# Altium footprint library 9-Pcblib_Con.PcbLib: 266 footprints (part 13 of 17)
Each footprint in its own frame and in the unit in brackets; x right, y up, seen from the top. Pads: shape width x height; smd on the part's side, far side on the other; paste and mask are expansions set on the pad; w line width, h text height; cw(c..) or ccw(c..) is an arc to the next point about the centre after c.
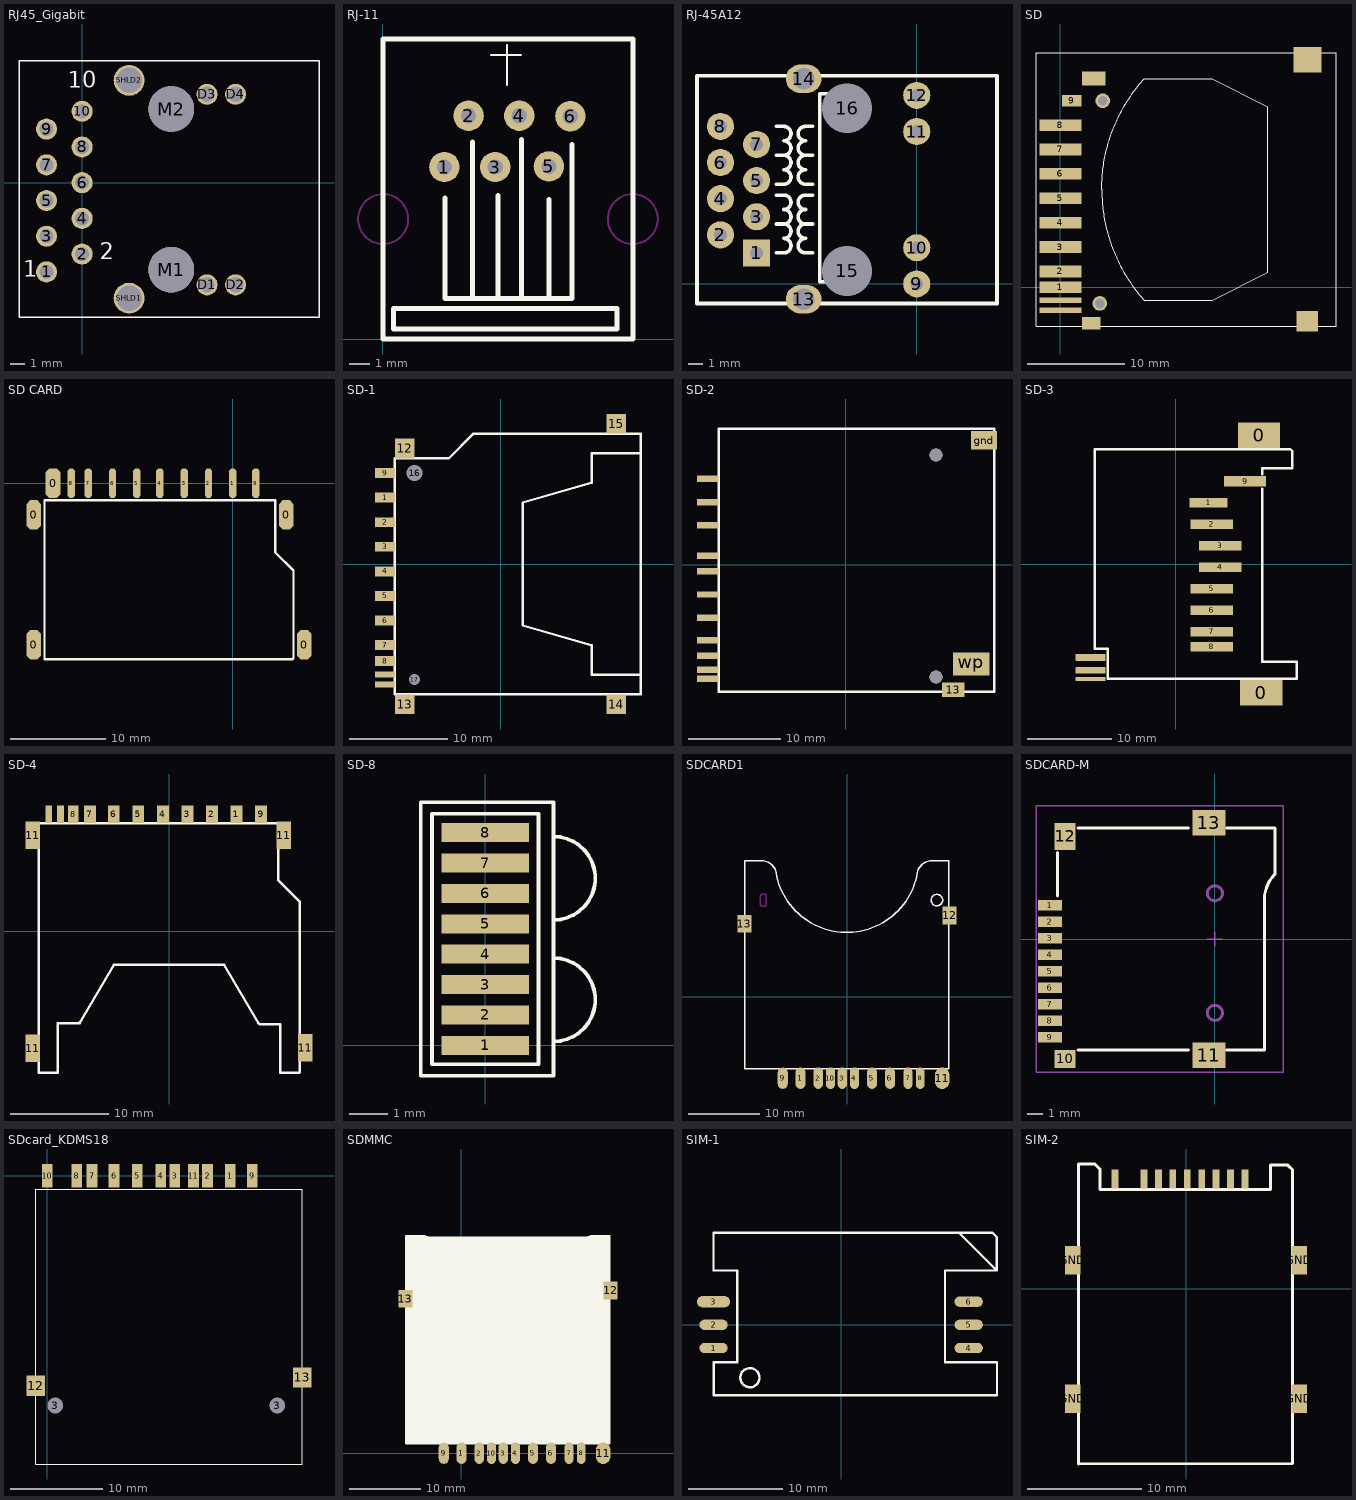
[diagram p12: the footprints below, top view; thin cyan lines are the x and y axes]

## RJ45_Gigabit [mm]
pads (18):
  round 1.5 hole 1: 1(-2.53,-6.35) 2(0,-5.08) 3(-2.53,-3.81) 4(0,-2.54) 5(-2.53,-1.27) 6(0,0) 7(-2.53,1.27) 8(0,2.54) 9(-2.53,3.81) 10(0,5.08)
  round 1.5 hole 1.1: D1(8.89,-7.27) D2(10.92,-7.27) D3(8.89,6.29) D4(10.92,6.29)
  round 3.25 hole 3.25 unplated paste+0 mask+0: M1(6.35,-6.19) M2(6.35,5.24)
  round 2.2 hole 1.8: SHLD1(3.35,-8.22) SHLD2(3.35,7.28)
Top Overlay:
  lines w0.1: -4.49,-9.575 16.86,-9.575 16.86,8.675 -4.49,8.675 -4.49,-9.575
  text "2" at 1.27,-5.842 h2
  text "1" at -4.175,-7.075 h2
  text "10" at -1.016,6.35 h2
3D body: height 16.12, standoff -2.58, extent -4.435,-10.686 17.355,9.304

## RJ-11 [mil]
height 590.55
pads (6):
  round 60 hole 30: 1(121.58,338.63) 2(169.06,439.73) 3(221.58,338.63) 4(269.06,439.73) 5(327.25,339.73) 6(369.46,438.63)
Top Overlay:
  lines w3.94: 213.07,559.08 272.13,559.08 ; 244.57,500.02 244.57,559.08 ; 244.57,555.14 244.57,578.76
  lines w10: 123,277.53 123,80.04 373,80.04 373,382.49 ; 176.94,80.04 176.94,387.53 ; 226.94,80.04 226.94,282.56 ; 273,80.04 273,392.88 ; 327.72,80.04 327.72,274.38 ; 488.66,0.04 0.95,0.04 0.95,590.6 493.08,590.6 ; 492.76,0.04 492.76,590.6 ; 20.95,20.04 20.95,60.04 460.95,60.04 460.95,20.04 20.95,20.04
Keep-Out Layer:
  circle w3.94: c492.44,236.11 r49.21
  circle w3.94: c0.95,236.11 r49.21

## RJ-45A12 [mil]
pads (16):
  rect 75x75 hole 35.43: 1(-442.91,85.83)
  round 75 hole 35.43: 2(-542.91,135.83) 3(-442.91,185.83) 4(-542.91,235.83) 5(-442.91,285.83) 6(-542.91,335.83) 7(-442.91,385.83) 8(-542.91,435.83) 9(0,0) 10(0,100) 11(0,421.65) 12(0,521.65)
  oval 98.43x78.74 hole 59.06: 13(-312.99,-42.13) 14(-312.99,567.32)
  round 130 hole 137.8: 15(-192.91,35.83) 16(-192.91,485.83)
Top Overlay:
  lines w10: -387.91,85.83 -367.91,85.83 ccw(c-367.91,105.83) -367.91,125.83 ccw(c-367.91,145.83) -367.91,165.83 ; -387.91,165.83 -367.91,165.83 ; -387.91,245.83 -367.91,245.83 cw(c-367.91,225.83) -367.91,205.83 cw(c-367.91,185.83) -367.91,165.83 ; -387.91,275.83 -367.91,275.83 ccw(c-367.91,295.83) -367.91,315.83 ccw(c-367.91,335.83) -367.91,355.83 ; -387.91,355.83 -367.91,355.83 ; -387.91,435.83 -367.91,435.83 cw(c-367.91,415.83) -367.91,395.83 cw(c-367.91,375.83) -367.91,355.83 ; -287.91,85.83 -307.91,85.83 cw(c-307.91,105.83) -307.91,125.83 cw(c-307.91,145.83) -307.91,165.83 ; -287.91,165.83 -307.91,165.83 ; -287.91,245.83 -307.91,245.83 ccw(c-307.91,225.83) -307.91,205.83 ccw(c-307.91,185.83) -307.91,165.83 ; -287.91,275.83 -307.91,275.83 cw(c-307.91,295.83) -307.91,315.83 cw(c-307.91,335.83) -307.91,355.83 ; -287.91,355.83 -307.91,355.83 ; -287.91,435.83 -307.91,435.83 ccw(c-307.91,415.83) -307.91,395.83 ccw(c-307.91,375.83) -307.91,355.83 ; -247.91,5.83 -267.91,5.83 -267.91,525.83 -247.91,525.83 ; -607.91,-54.17 -607.91,575.83 222,575.83 222,-54.17 -607.91,-54.17
Multi-Layer:
  text "J10" at -517.7,505.32 h25
3D body: height 59.06, standoff -590.55, extent -605.26,-53 237.26,572.2

## SD [mil]
pads (17):
  rect 169.3x47.2 smd: 1(0,0) 2(0,64) 3(0,162.4) 4(0,260.8) 5(0,359.2) 6(0,457.7) 7(0,556.1) 8(0,654.5)
  rect 78.7x47.2 smd: 9(45.3,752.9)
  rect 169.3x23.62 smd: 10(0,-52.19) 11(0,-92.57)
  rect 74.8x51.2 smd: ""(125,-144.7)
  rect 94.5x55.1 smd: ""(133.86,842.5)
  round 59.1 hole 39.37: ""(159.02,-65.01) ""(170.83,752.9)
  rect 86.6x82.7 smd: ""(997,-136.8)
  rect 114.2x102.4 smd: ""(997,918.26)
Top Overlay:
  lines w3.94: -98.42,-156.5 -98.42,945.8 1112.2,945.8 1112.2,-156.5 -98.42,-156.5 ; 166.93,394.7 167.03,384.6 167.23,374.6 167.63,364.6 168.13,354.6 168.83,344.6 169.63,334.7 170.63,324.7 171.73,314.8 172.93,304.8 174.43,294.9 175.93,285 177.63,275.2 179.53,265.3 181.53,255.5 183.73,245.7 186.03,236 188.43,226.3 191.03,216.6 193.73,207 196.63,197.4 199.63,187.8 202.83,178.3 206.13,168.9 209.63,159.5 213.23,150.1 216.93,140.8 220.83,131.6 224.83,122.4 228.93,113.3 233.23,104.3 237.63,95.3 242.13,86.4 246.83,77.5 251.63,68.7 256.63,60 261.63,51.4 266.83,42.8 272.23,34.3 277.63,25.9 283.23,17.6 288.93,9.4 294.73,1.3 300.73,-6.8 306.73,-14.8 312.93,-22.6 319.23,-30.4 325.63,-38.1 332.23,-45.7 338.83,-53.2 612.83,-53.2 836.23,60 836.23,729.3 612.83,842.5 338.83,842.5 332.23,835 325.63,827.4 319.23,819.7 312.93,812 306.73,804.1 300.73,796.1 294.73,788.1 288.93,779.9 283.23,771.7 277.63,763.4 272.23,755 266.83,746.5 261.63,737.9 256.63,729.3 251.63,720.6 246.83,711.8 242.13,703 237.63,694 233.23,685.1 228.93,676 224.83,666.9 220.83,657.7 216.93,648.5 213.23,639.2 209.63,629.8 206.13,620.4 202.83,611 199.63,601.5 196.63,591.9 193.73,582.4 191.03,572.7 188.43,563 186.03,553.3 183.73,543.6 181.53,533.8 179.53,524 177.63,514.2 175.93,504.3 174.43,494.4 172.93,484.5 171.73,474.6 170.63,464.6 169.63,454.7 168.83,444.7 168.13,434.7 167.63,424.7 167.23,414.7 167.03,404.7 166.93,394.7

## SD CARD [mil]
pads (14):
  oct 60x120 smd: 0(-820,-665) 0(-820,-130) 0(-740,0) 0(220,-130) 0(295,-665)
  oct 30x120 smd: 1(0,0) 2(-100,0) 3(-200,0) 4(-300,0) 5(-395,0) 6(-495,0) 7(-595,0) 8(-665,0) 9(95,0)
Top Overlay:
  lines w10: -775,-725 245,-725 250,-720 250,-360 175,-285 175,-70 -775,-70 -775,-725
3D body: height 118.57, standoff -38.91, extent -848.99,-1369.64 276.99,28

## SD-1 [mm]
pads (17):
  rect 2x1 smd: 1(-11.75,6.75) 2(-11.75,4.25) 3(-11.75,1.75) 4(-11.75,-0.75) 5(-11.75,-3.25) 6(-11.75,-5.75) 7(-11.75,-8.25) 8(-11.75,-9.875) 9(-11.75,9.25)
  rect 2x0.6 smd: 10(-11.75,-12.25) 11(-11.75,-11.25)
  rect 2x2 smd: 12(-9.75,11.75) 13(-9.75,-14.25) 14(11.75,-14.25) 15(11.75,14.25)
  round 1.5 hole 1.6: 16(-8.75,9.25)
  round 1 hole 1.1: 17(-8.75,-11.75)
Top Overlay:
  lines w0.254: 14.25,-11.25 9.25,-11.25 9.25,-8.25 2.25,-6.25 2.25,6.25 9.25,8.25 9.25,11.25 14.25,11.25 ; -10.75,-13.25 -10.75,10.75 -5.25,10.75 -2.75,13.25 14.25,13.25 14.25,-13.25 -10.75,-13.25

## SD-2 [mm]
pads (14):
  rect 2.35x0.7 smd: 1(-14.935,6.8) 2(-14.935,4.3) 3(-14.935,1) 4(-14.935,-0.7) 5(-14.935,-3.2) 6(-14.935,-5.7) 7(-14.935,-8.13) 8(-14.935,-9.82) 9(-14.935,9.3) cd(-14.935,-11.32) com(-14.935,-12.32)
  rect 2.4x1.6 smd: 13(11.595,-13.5)
  rect 2.8x2 smd: gnd(14.935,13.5)
  rect 3.95x2.5 smd: wp(13.565,-10.7)
via 9.735,11.9 diameter 1.4 hole 1.4
via 9.735,-12.1 diameter 1.4 hole 1.4
Top Overlay:
  lines w0.254: -13.76,-13.72 16.045,-13.72 16.045,14.72 -13.76,14.72 -13.76,-13.72

## SD-3 [mm]
pads (14):
  rect 5x3 smd: 0(9.843,15.24) 0(10.097,-15.24)
  rect 4.5x1.143 smd: 1(3.874,7.239)
  rect 5x1.143 smd: 2(4.255,4.699) 3(5.271,2.159) 4(5.271,-0.381) 5(4.255,-2.921) 6(4.255,-5.461) 7(4.255,-8.001) 8(4.255,-9.779)
  rect 5x1.27 smd: 9(8.192,9.779)
  rect 3.556x0.8 smd: 10(-10.097,-11.049) 11(-10.097,-12.573)
  rect 3.556x0.5 smd: 12(-10.097,-13.589)
Top Overlay:
  lines w0.3: 7.683,-13.589 14.287,-13.589 14.287,-11.557 10.223,-11.557 10.223,8.889 ; 8.191,-13.589 -8.065,-13.589 -8.065,-10.033 -9.589,-10.033 -9.589,13.589 8.191,13.589 13.525,13.589 13.779,13.335 13.779,11.303 10.223,11.303 10.223,10.59

## SD-4 [mm]
pads (15):
  rect 1.2x1.8 smd: 1(6.858,11.917) 2(4.369,11.917) 3(1.875,11.908) 4(-0.625,11.908) 5(-3.125,11.908) 6(-5.625,11.908) 7(-8.05,11.908) 9(9.375,11.908)
  rect 1.1x1.8 smd: 8(-9.754,11.917)
  rect 0.7x1.8 smd: 10(-11.05,11.908) 12(-12.243,11.917)
  rect 1.5x2.8 smd: 11(-13.868,-11.917) 11(-13.868,9.774) 11(11.684,9.774) 11(13.868,-11.866)
Top Overlay:
  lines w0.254: -11.3,-9.383 -11.3,-14.383 -13.273,-14.383 -13.273,11.003 -13.259,11.017 11.1,11.017 11.1,5.207 13.289,3.018 13.3,3.018 13.3,-14.356 13.273,-14.383 11.3,-14.383 11.3,-9.484 9.258,-9.484 9.1,-9.326 ; -11.249,-9.377 -9.207,-9.377 -9.049,-9.219 ; -9.1,-9.377 -5.588,-3.383 ; -5.6,-3.383 5.6,-3.383 9.1,-9.377
Multi-Layer:
  circle w0.254: c9.5,8.657 r0.82
  circle w0.254: c-11.532,8.617 r0.58

## SD-8 [mm]
pads (8):
  rect 2.3x0.5 smd: 1(0,0) 2(0,0.8) 3(0,1.6) 4(0,2.4) 5(0,3.2) 6(0,4) 7(0,4.8) 8(0,5.6)
Top Overlay:
  lines w0.1: 1.8,0.102 ccw(c1.8,1.201) 1.8,2.3 ; 1.8,3.3 ccw(c1.8,4.399) 1.8,5.498 ; -1.7,-0.8 1.8,-0.8 1.8,6.4 -1.7,6.4 -1.7,-0.8 ; -1.4,-0.5 1.4,-0.5 1.4,6.1 -1.4,6.1 -1.4,-0.5

## SDCARD1 [mm]
height 1.2
pads (13):
  oval 1.4x3 smd: 1(-6.513,-11.36) 5(3.47,-11.36) 6(5.984,-11.36) 9(-8.976,-11.36)
  oval 1.3x3 smd: 2(-4.023,-11.36) 3(-0.671,-11.36) 4(1.031,-11.36) 10(-2.322,-11.36)
  oval 1.2x3 smd: 7(8.499,-11.36) 8(10.201,-11.36)
  oval 2x3 smd: 11(13.261,-11.373)
  rect 2x2.5 smd: 12(14.287,11.347) 13(-14.313,10.179)
Top Overlay:
  circle w0.203: c12.526,13.477 r0.8
  lines w0.203: -14.299,-10.023 14.201,-10.023 14.201,18.977 11.783,18.977 ccw(c11.783,16.977) 9.811,17.311 cw(c-0.049,18.977) -9.909,17.311 ccw(c-11.881,16.977) -11.881,18.977 -14.299,18.977 -14.299,-10.023
Keep-Out Layer:
  circle w0.203: c12.526,13.477 r0.8
  lines w0.203: -12.094,12.977 -12.094,13.977 ; -12.094,13.202 -12.094,12.922 ccw(c-11.794,12.922) -11.794,12.622 ; -12.094,14.014 cw(c-11.794,14.014) -11.794,14.314 ; -11.814,12.627 -11.574,12.627 ; -11.754,14.314 -11.554,14.314 cw(c-11.554,14.014) -11.254,14.014 ; -11.554,12.622 ccw(c-11.554,12.922) -11.254,12.922 -11.254,13.278 ; -11.254,12.977 -11.254,13.977
3D body: height 2.85, standoff -0.5, extent -14.408,-11.388 14.392,18.912

## SDCARD-M [mm] "TF卡"
height 1.5
pads (13):
  rect 1.6x0.7 smd: 1(-11.008,2.25) 2(-11.008,1.15) 3(-11.008,0.05) 4(-11.008,-1.05) 5(-11.008,-2.15) 6(-11.008,-3.25) 7(-11.008,-4.35) 8(-11.008,-5.45) 9(-11.008,-6.55)
  rect 1.4x1.2 smd: 10(-10,-8.004)
  rect 2.2x1.7 smd: 11(-0.4,-7.75) 13(-0.4,7.75)
  rect 1.4x1.8 smd: 12(-10,6.85)
Top Overlay:
  lines w0.2: -10.5,2.88 -10.5,5.756 ; -9.144,-7.4 -1.778,-7.4 ; -9.144,7.4 -1.778,7.4 ; 0.762,-7.4 3.3,-7.4 3.3,1.016 ; 0.762,7.4 4,7.4 4,4.318 ccw(c5.69,2.628) 3.3,2.628 3.3,0.762
Mechanical 1:
  circle w0.2: c0,-4.93 r0.5
  circle w0.2: c0,3.05 r0.5
Mechanical 15:
  lines w0.1: -0.5,0 0.5,0 ; 0,-0.5 0,0.5 ; -11.938,-8.89 4.572,-8.89 4.572,8.89 -11.938,8.89 -11.938,-8.89

## SDcard_KDMS18 [mm]
pads (15):
  rect 1.15x2.55 smd: 1(19.916,0) 2(17.426,0) 3(13.87,0) 4(12.346,0) 5(9.806,0) 6(7.266,0) 7(4.876,-0.001) 8(3.202,0) 9(22.306,0) 10(0,0) 11(15.902,0)
  round 1.5 hole 1.7: 3(0.891,-24.968) 3(25.021,-24.968)
  rect 2x2.2 smd: 12(-1.237,-22.809) 13(27.719,-21.92)
Top Overlay:
  lines w0.1: -1.224,-31.321 -1.224,-1.476 27.732,-1.476 27.732,-31.321 -1.224,-31.321

## SDMMC [mm]
pads (13):
  oval 1.4x3 smd: 1(0,0) 5(9.982,0) 6(12.497,0) 9(-2.464,0)
  oval 1.3x3 smd: 2(2.489,0) 3(5.842,0) 4(7.544,0) 10(4.191,0)
  oval 1.2x3 smd: 7(15.011,0) 8(16.713,0)
  oval 2x3 smd: 11(19.774,-0.013)
  rect 2x2.5 smd: 12(20.8,22.708) 13(-7.8,21.539)
Top Overlay:
  rectangle: -7.661,1.429 20.635,19.844
  rectangle: -7.762,19.717 20.66,30.258
  lines w0.203: -7.786,1.338 -7.786,30.338 -5.369,30.338 cw(c-5.369,28.338) -3.397,28.671 ccw(c6.464,30.338) 16.324,28.671 cw(c18.296,28.338) 18.296,30.338 20.714,30.338 20.714,1.338 -7.786,1.338
Keep-Out Layer:
  circle w0.203: c19.039,24.838 r0.8
  lines w0.203: -5.581,24.338 -5.581,25.338 ; -5.581,24.562 -5.581,24.282 ccw(c-5.281,24.282) -5.281,23.982 ; -5.581,25.375 cw(c-5.281,25.375) -5.281,25.675 ; -5.301,23.988 -5.061,23.988 ; -5.241,25.675 -5.041,25.675 cw(c-5.041,25.375) -4.741,25.375 ; -5.041,23.982 ccw(c-5.041,24.282) -4.741,24.282 -4.741,24.638 ; -4.741,24.338 -4.741,25.338

## SIM-1 [mm]
pads (6):
  oval 3x1.1 smd: 1(-13.5,-2.45) 2(-13.5,0) 4(13.5,-2.45) 5(13.5,0) 6(13.5,2.45)
  oval 3.5x1.2 smd: 3(-13.5,2.45)
Top Overlay:
  circle w0.254: c-9.652,-5.588 r1.016
  lines w0.254: -13.495,-7.43 -13.495,-3.95 -11,-3.95 -11,5.735 ; -13.475,-7.45 16.5,-7.45 ; -11,5.75 -13.492,5.75 -13.5,5.758 -13.5,9.75 16.011,9.75 16.467,9.294 16.467,5.75 ; 11,-3.95 11,5.75 16.467,5.75 ; 11.005,-3.95 14.923,-3.95 ; 12.467,9.75 16.467,5.75 ; 14.542,-3.95 16.495,-3.95 16.495,-7.445

## SIM-2 [mm]
pads (13):
  rect 0.6x1.65 smd: 0(-6.25,9.662) 0(-3.7,9.662) 0(-2.43,9.662) 0(-1.16,9.662) 0(0.11,9.662) 0(1.38,9.662) 0(2.65,9.662) 0(3.92,9.662) 0(5.19,9.662)
  rect 1.35x2.5 smd: GND(-9.95,-9.662) GND(-9.95,2.538) GND(9.95,-9.662) GND(9.95,2.537)
Top Overlay:
  lines w0.254: -9.44,-15.382 9.356,-15.331 9.356,10.475 8.949,10.882 7.425,10.882 7.425,8.748 -7.561,8.748 -7.561,10.526 -8.018,10.983 -9.186,10.983 -9.44,10.983 -9.44,-15.382